# Altium footprint library SOP封装库.PcbLib: 52 footprints (part 3 of 4)
Each footprint in its own frame and in the unit in brackets; x right, y up, seen from the top. Pads: shape width x height; smd on the part's side, far side on the other; paste and mask are expansions set on the pad; w line width, h text height; cw(c..) or ccw(c..) is an arc to the next point about the centre after c.
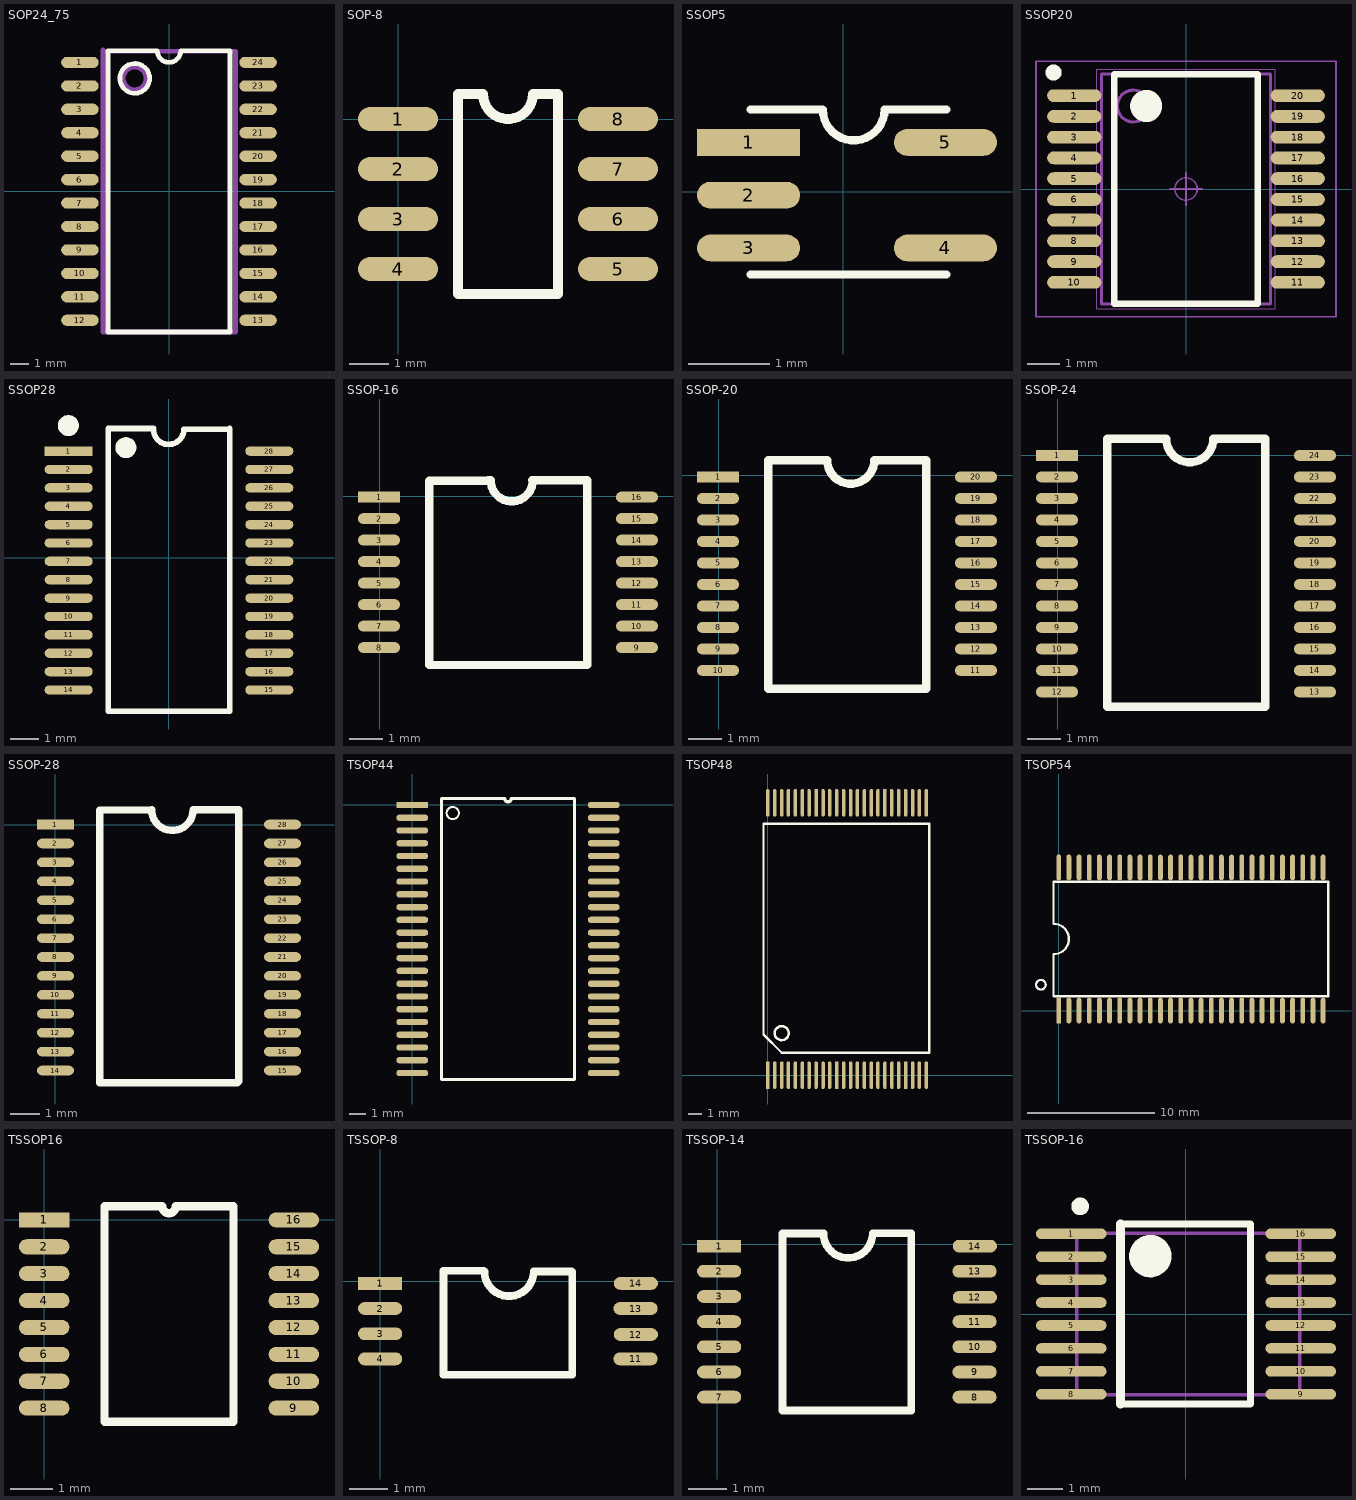
[diagram p2: the footprints below, top view; thin cyan lines are the x and y axes]

## SOP24_75 [mil]
pads (24):
  oval 80x24 smd: 1(-190,275) 2(-190,225) 3(-190,175) 4(-190,125) 5(-190,75) 6(-190,25) 7(-190,-25) 8(-190,-75) 9(-190,-125) 10(-190,-175) 11(-190,-225) 12(-190,-275) 13(190,-275) 14(190,-225) 15(190,-175) 16(190,-125) 17(190,-75) 18(190,-25) 19(190,25) 20(190,75) 21(190,125) 22(190,175) 23(190,225) 24(190,275)
Top Overlay:
  circle w10: c-73,241 r31.76
  lines w10: -130,-300 -130,300 -25,300 ccw(c0,300) 25,300 130,300 130,-300 -130,-300
Mechanical 15:
  circle w10: c-73.21,241 r24.21
  lines w10: -141,302 -141,-300 142,-300 142,299 -140,299

## SOP-8 [mil]
height 39.37
pads (8):
  oval 80x24 smd: 1(0,0) 2(0,-50) 3(0,-100) 4(0,-150) 5(220,-150) 6(220,-100) 7(220,-50) 8(220,0)
Top Overlay:
  lines w10: 60,-175 160,-175 160,25 135,25 cw(c110,25) 85,25 60,25 60,-175
3D body: height 73.87, standoff -1.02, extent -14.78,-173.25 234.78,23.75

## SSOP5 [mil]
pads (5):
  rect 50x12.99 smd: 1(-46,24)
  oval 50x12.99 smd: 2(-46,-1.59) 3(-46,-27.18) 4(49.49,-27.18) 5(49.49,24)
Top Overlay:
  lines w3.94: -45,-40 50,-40 ; -45,40 -10,40 ccw(c5,40) 20,40 50,40

## SSOP20 [mm]
pads (20):
  oval 1.7x0.4 smd: 1(-3.5,2.925) 2(-3.5,2.275) 3(-3.5,1.625) 4(-3.5,0.975) 5(-3.5,0.325) 6(-3.5,-0.325) 7(-3.5,-0.975) 8(-3.5,-1.625) 9(-3.5,-2.275) 10(-3.5,-2.925) 11(3.5,-2.925) 12(3.5,-2.275) 13(3.5,-1.625) 14(3.5,-0.975) 15(3.5,-0.325) 16(3.5,0.325) 17(3.5,0.975) 18(3.5,1.625) 19(3.5,2.275) 20(3.5,2.925)
Top Overlay:
  circle w0.25: c-4.15,3.65 r0.125
  circle w0.5: c-1.25,2.6 r0.25
  lines w0.2: -2.25,-3.6 -2.25,3.6 2.25,3.6 2.25,-3.6 -2.25,-3.6
Mechanical 15:
  circle w0.1: c-1.65,2.6 r0.5
  lines w0.1: -2.65,-3.6 -2.65,3.6 2.65,3.6 2.65,-3.6 -2.65,-3.6
Mechanical 16:
  circle w0.05: c0,0 r0.35
  lines w0.001: -2.8,-3.75 -2.8,3.75 2.8,3.75 2.8,-3.75 -2.8,-3.75
  lines w0.05: -0.5,0 0.5,0 ; 0,-0.5 0,0.5 ; -4.7,-4 -4.7,4 4.7,4 4.7,-4 -4.7,-4
3D body: height 1, standoff 0, extent -3.531,-3.785 3.607,3.734

## SSOP28 [mm]
pads (30):
  rect 1.7x0.33 smd: 1(-3.545,3.773)
  oval 1.7x0.33 smd: 2(-3.545,3.123) 3(-3.545,2.473) 4(-3.545,1.823) 5(-3.545,1.173) 6(-3.545,0.523) 7(-3.545,-0.127) 8(-3.545,-0.777) 9(-3.545,-1.427) 10(-3.545,-2.077) 11(-3.545,-2.727) 12(-3.545,-3.377) 13(-3.545,-4.027) 14(-3.545,-4.677) 15(3.555,-4.677) 16(3.555,-4.027) 17(3.555,-3.377) 18(3.555,-2.727) 19(3.555,-2.077) 20(3.555,-1.427) 21(3.555,-0.777) 22(3.555,-0.127) 23(3.555,0.523) 24(3.555,1.173) 25(3.555,1.823) 26(3.555,2.473) 27(3.555,3.123) 28(3.555,3.773)
  round 0.75 on Top Overlay: ""(-3.555,4.677) ""(-1.52,3.898)
Top Overlay:
  lines w0.2: -0.547,4.548 ccw(c-0.009,4.547) 0.53,4.548
  lines w0.203: -0.545,4.573 -2.145,4.573 -2.145,-5.427 2.155,-5.427 2.155,4.573 ; 0.53,4.548 2.13,4.548

## SSOP-16 [mm]
pads (16):
  rect 1.27x0.33 smd: 1(-0.025,-0.025)
  oval 1.27x0.33 smd: 2(-0.025,-0.675) 3(-0.025,-1.325) 4(-0.025,-1.975) 5(-0.025,-2.625) 6(-0.025,-3.275) 7(-0.025,-3.925) 8(-0.025,-4.575) 9(7.775,-4.575) 10(7.775,-3.925) 11(7.775,-3.275) 12(7.775,-2.625) 13(7.775,-1.975) 14(7.775,-1.325) 15(7.775,-0.675) 16(7.775,-0.025)
Top Overlay:
  lines w0.254: 1.499,-5.1 1.499,0.475 3.269,0.475 3.277,0.483 ; 1.549,-5.1 6.274,-5.1 6.274,0.475 6.266,0.483 4.6,0.483 ; 3.353,0.483 ccw(c3.988,0.483) 4.623,0.483

## SSOP-20 [mm]
pads (20):
  rect 1.27x0.33 smd: 1(-0.025,-0.051)
  oval 1.27x0.33 smd: 2(-0.025,-0.701) 3(-0.025,-1.351) 4(-0.025,-2.001) 5(-0.025,-2.651) 6(-0.025,-3.301) 7(-0.025,-3.951) 8(-0.025,-4.601) 9(-0.025,-5.251) 10(-0.025,-5.901) 11(7.775,-5.901) 12(7.775,-5.251) 13(7.775,-4.601) 14(7.775,-3.951) 15(7.775,-3.301) 16(7.775,-2.651) 17(7.775,-2.001) 18(7.775,-1.351) 19(7.775,-0.701) 20(7.775,-0.051)
Top Overlay:
  lines w0.254: 6.223,-6.45 1.499,-6.45 1.499,0.449 3.269,0.449 3.277,0.457 ccw(c3.99,0.457) 4.703,0.457 6.266,0.457 6.274,0.449 6.274,-6.45

## SSOP-24 [mm]
pads (24):
  rect 1.27x0.33 smd: 1(-0.025,0)
  oval 1.27x0.33 smd: 2(-0.025,-0.65) 3(-0.025,-1.3) 4(-0.025,-1.95) 5(-0.025,-2.6) 6(-0.025,-3.25) 7(-0.025,-3.9) 8(-0.025,-4.55) 9(-0.025,-5.2) 10(-0.025,-5.85) 11(-0.025,-6.5) 12(-0.025,-7.15) 13(7.775,-7.15) 14(7.775,-6.5) 15(7.775,-5.85) 16(7.775,-5.2) 17(7.775,-4.55) 18(7.775,-3.9) 19(7.775,-3.25) 20(7.775,-2.6) 21(7.775,-1.95) 22(7.775,-1.3) 23(7.775,-0.65) 24(7.775,0)
Top Overlay:
  lines w0.254: 6.223,-7.6 1.499,-7.6 1.499,0.5 3.269,0.5 3.277,0.508 ccw(c3.99,0.508) 4.703,0.508 6.266,0.508 6.274,0.5 6.274,-7.6

## SSOP-28 [mm]
pads (28):
  rect 1.27x0.33 smd: 1(0,0)
  oval 1.27x0.33 smd: 2(0,-0.65) 3(0,-1.3) 4(0,-1.95) 5(0,-2.6) 6(0,-3.25) 7(0,-3.9) 8(0,-4.55) 9(0,-5.2) 10(0,-5.85) 11(0,-6.5) 12(0,-7.15) 13(0,-7.8) 14(0,-8.45) 15(7.8,-8.45) 16(7.8,-7.8) 17(7.8,-7.15) 18(7.8,-6.5) 19(7.8,-5.85) 20(7.8,-5.2) 21(7.8,-4.55) 22(7.8,-3.9) 23(7.8,-3.25) 24(7.8,-2.6) 25(7.8,-1.95) 26(7.8,-1.3) 27(7.8,-0.65) 28(7.8,0)
Top Overlay:
  lines w0.254: 1.524,-8.865 6.248,-8.865 6.299,-8.814 6.299,0.5 6.291,0.508 4.728,0.508 cw(c4.015,0.508) 3.302,0.508 3.294,0.5 1.524,0.5 1.524,-8.865

## TSOP44 [mm]
pads (44):
  rect 2x0.4 smd: 1(0,0)
  oval 2x0.4 smd: 2(0,-0.8) 3(0,-1.6) 4(0,-2.4) 5(0,-3.2) 6(0,-4) 7(0,-4.8) 8(0,-5.6) 9(0,-6.4) 10(0,-7.2) 11(0,-8) 12(0,-8.8) 13(0,-9.6) 14(0,-10.4) 15(0,-11.2) 16(0,-12) 17(0,-12.8) 18(0,-13.6) 19(0,-14.4) 20(0,-15.2) 21(0,-16) 22(0,-16.8) 23(12,-16.8) 24(12,-16) 25(12,-15.2) 26(12,-14.4) 27(12,-13.6) 28(12,-12.8) 29(12,-12) 30(12,-11.2) 31(12,-10.4) 32(12,-9.6) 33(12,-8.8) 34(12,-8) 35(12,-7.2) 36(12,-6.4) 37(12,-5.6) 38(12,-4.8) 39(12,-4) 40(12,-3.2) 41(12,-2.4) 42(12,-1.6) 43(12,-0.8) 44(12,0)
Top Overlay:
  circle w0.127: c2.54,-0.508 r0.381
  lines w0.203: 1.838,-17.2 10.162,-17.2 10.162,0.4 6.2,0.4 cw(c6,0.4) 5.8,0.4 1.838,0.4 1.838,-17.2

## TSOP48 [mil]
pads (48):
  rect 10x79 smd: 1(0,0) 11(197,0.02) 21(394,0.02) 31(335,778) 41(138,778.02)
  oval 10x79 smd: 2(20,0.02) 3(40,0.02) 4(59,0.02) 5(79,0.02) 6(99,0.02) 7(118,0.02) 8(138,0.02) 9(158,0.02) 10(177,0) 12(217,0.02) 13(237,0.02) 14(256,0.02) 15(276,0.02) 16(296,0.02) 17(315,0.02) 18(335,0.02) 19(355,0.02) 20(374,0) 22(414,0.02) 23(433,0.02) 24(453,0.02) 25(453,778.02) 26(433,778.02) 27(414,778.02) 28(394,778.02) 29(374,778) 30(354,778) 32(315,778.02) 33(296,778.02) 34(276,778.02) 35(256,778.02) 36(237,778.02) 37(217,778.02) 38(197,778.02) 39(177,778.02) 40(158,778) 42(118,778.02) 43(99,778.02) 44(79,778.02) 45(59,778.02) 46(40,778.02) 47(20,778.02) 48(0,778.02)
Top Overlay:
  circle w7: c40,120 r20
  lines w7: -12,116.02 40,64.02 461,64.02 461,718.02 -12,718.02 -12,116.02

## TSOP54 [mil]
pads (54):
  rect 15x80 smd: 1(0,0)
  oval 15x80 smd: 2(31.5,0) 3(62.99,0) 4(94.49,0) 5(125.98,0) 6(157.48,0) 7(188.98,0) 8(220.47,0) 9(251.97,0) 10(283.47,0) 11(314.96,0) 12(346.46,0) 13(377.95,0) 14(409.45,0) 15(440.94,0) 16(472.44,0) 17(503.94,0) 18(535.43,0) 19(566.93,0) 20(598.43,0) 21(629.92,0) 22(661.42,0) 23(692.91,0) 24(724.41,0) 25(755.91,0) 26(787.4,0) 27(818.9,0) 28(818.9,443.31) 29(787.4,443.31) 30(755.91,443.31) 31(724.41,443.31) 32(692.91,443.31) 33(661.42,443.31) 34(629.92,443.31) 35(598.43,443.31) 36(566.93,443.31) 37(535.43,443.31) 38(503.94,443.31) 39(472.44,443.31) 40(440.94,443.31) 41(409.45,443.31) 42(377.95,443.31) 43(346.46,443.31) 44(314.96,443.31) 45(283.47,443.31) 46(251.97,443.31) 47(220.47,443.31) 48(188.98,443.31) 49(157.48,443.31) 50(125.98,443.31) 51(94.49,443.31) 52(62.99,443.31) 53(31.5,443.31) 54(0,443.31)
Top Overlay:
  circle w7: c-55.31,80 r15
  lines w7: -15.75,173.78 -15.75,44.37 834.65,44.37 834.65,398.94 -15.75,398.94 -15.75,269.53 ; -15.75,174.41 ccw(c-15.75,221.65) -15.75,268.9

## TSSOP16 [mm]
pads (16):
  rect 1.2x0.36 smd: 1(0,0)
  oval 1.2x0.36 smd: 2(0,-0.64) 3(0,-1.28) 4(0,-1.92) 5(0,-2.56) 6(0,-3.2) 7(0,-3.84) 8(0,-4.48) 9(5.94,-4.48) 10(5.94,-3.84) 11(5.94,-3.2) 12(5.94,-2.56) 13(5.94,-1.92) 14(5.94,-1.28) 15(5.94,-0.64) 16(5.94,0)
Top Overlay:
  lines w0.2: 1.435,-4.8 1.435,0.32 2.81,0.32 ccw(c2.97,0.32) 3.13,0.32 4.505,0.32 4.505,-4.8 1.435,-4.8

## TSSOP-8 [mil]
pads (8):
  rect 45x12.99 smd: 1(-0.16,-2)
  oval 45x12.99 smd: 2(-0.16,-27.59) 3(-0.16,-53.18) 4(-0.16,-78.77) 11(259.69,-78.77) 12(260,-54) 13(259.69,-27.59) 14(260,-2)
Top Overlay:
  lines w7.87: 105.2,10.79 64.21,10.79 64.21,-94.88 195.31,-94.88 195.31,9.84 ; 106,10 ccw(c131,10) 156,10 194.52,10

## TSSOP-14 [mil]
pads (14):
  rect 45x12.99 smd: 1(1.84,-2)
  oval 45x12.99 smd: 2(1.84,-27.59) 3(1.84,-53.18) 4(1.84,-78.77) 5(1.84,-104.36) 6(1.84,-129.95) 7(1.84,-155.54) 8(261.69,-155.54) 9(261.69,-129.95) 10(261.69,-104.36) 11(261.69,-78.77) 12(262,-54) 13(261.69,-27.59) 14(262,-2)
Top Overlay:
  lines w7.87: 107.64,10.79 66.21,10.79 66.21,-169.29 197.31,-169.29 197.31,10.79 ; 108,11 ccw(c133,11) 158,11 197.11,11

## TSSOP-16 [mm]
pads (16):
  oval 2x0.3 smd: 1(-3.25,2.275) 2(-3.25,1.625) 3(-3.25,0.975) 4(-3.25,0.325) 5(-3.25,-0.325) 6(-3.25,-0.975) 7(-3.25,-1.625) 8(-3.25,-2.275) 9(3.25,-2.275) 10(3.25,-1.625) 11(3.25,-0.975) 12(3.25,-0.325) 13(3.25,0.325) 14(3.25,0.975) 15(3.25,1.625) 16(3.25,2.275)
Top Overlay:
  circle w0.6: c-1.01,1.64 r0.3
  circle w0.25: c-3,3.05 r0.125
  lines w0.2: -1.853,-2.55 1.83,-2.55 1.83,2.55 -1.853,2.55
  lines w0.254: -1.853,-2.55 -1.853,2.55
Mechanical 13:
  circle w0.1: c-1.05,1.6 r0.5
  lines w0.1: -1.853,-2.55 1.83,-2.55 1.83,2.55 -1.853,2.55 -1.853,-2.55
Mechanical 15:
  lines w0.1: -3.1,-2.286 3.227,-2.286 3.227,2.286 -3.1,2.286 -3.1,-2.286
3D body: height 1.45, standoff 0.02, extent -2.85,-2.56 2.85,2.54